# Altium footprint library OltestLib.PcbLib: 139 footprints (part 4 of 9)
Each footprint in its own frame and in the unit in brackets; x right, y up, seen from the top. Pads: shape width x height; smd on the part's side, far side on the other; paste and mask are expansions set on the pad; w line width, h text height; cw(c..) or ccw(c..) is an arc to the next point about the centre after c.
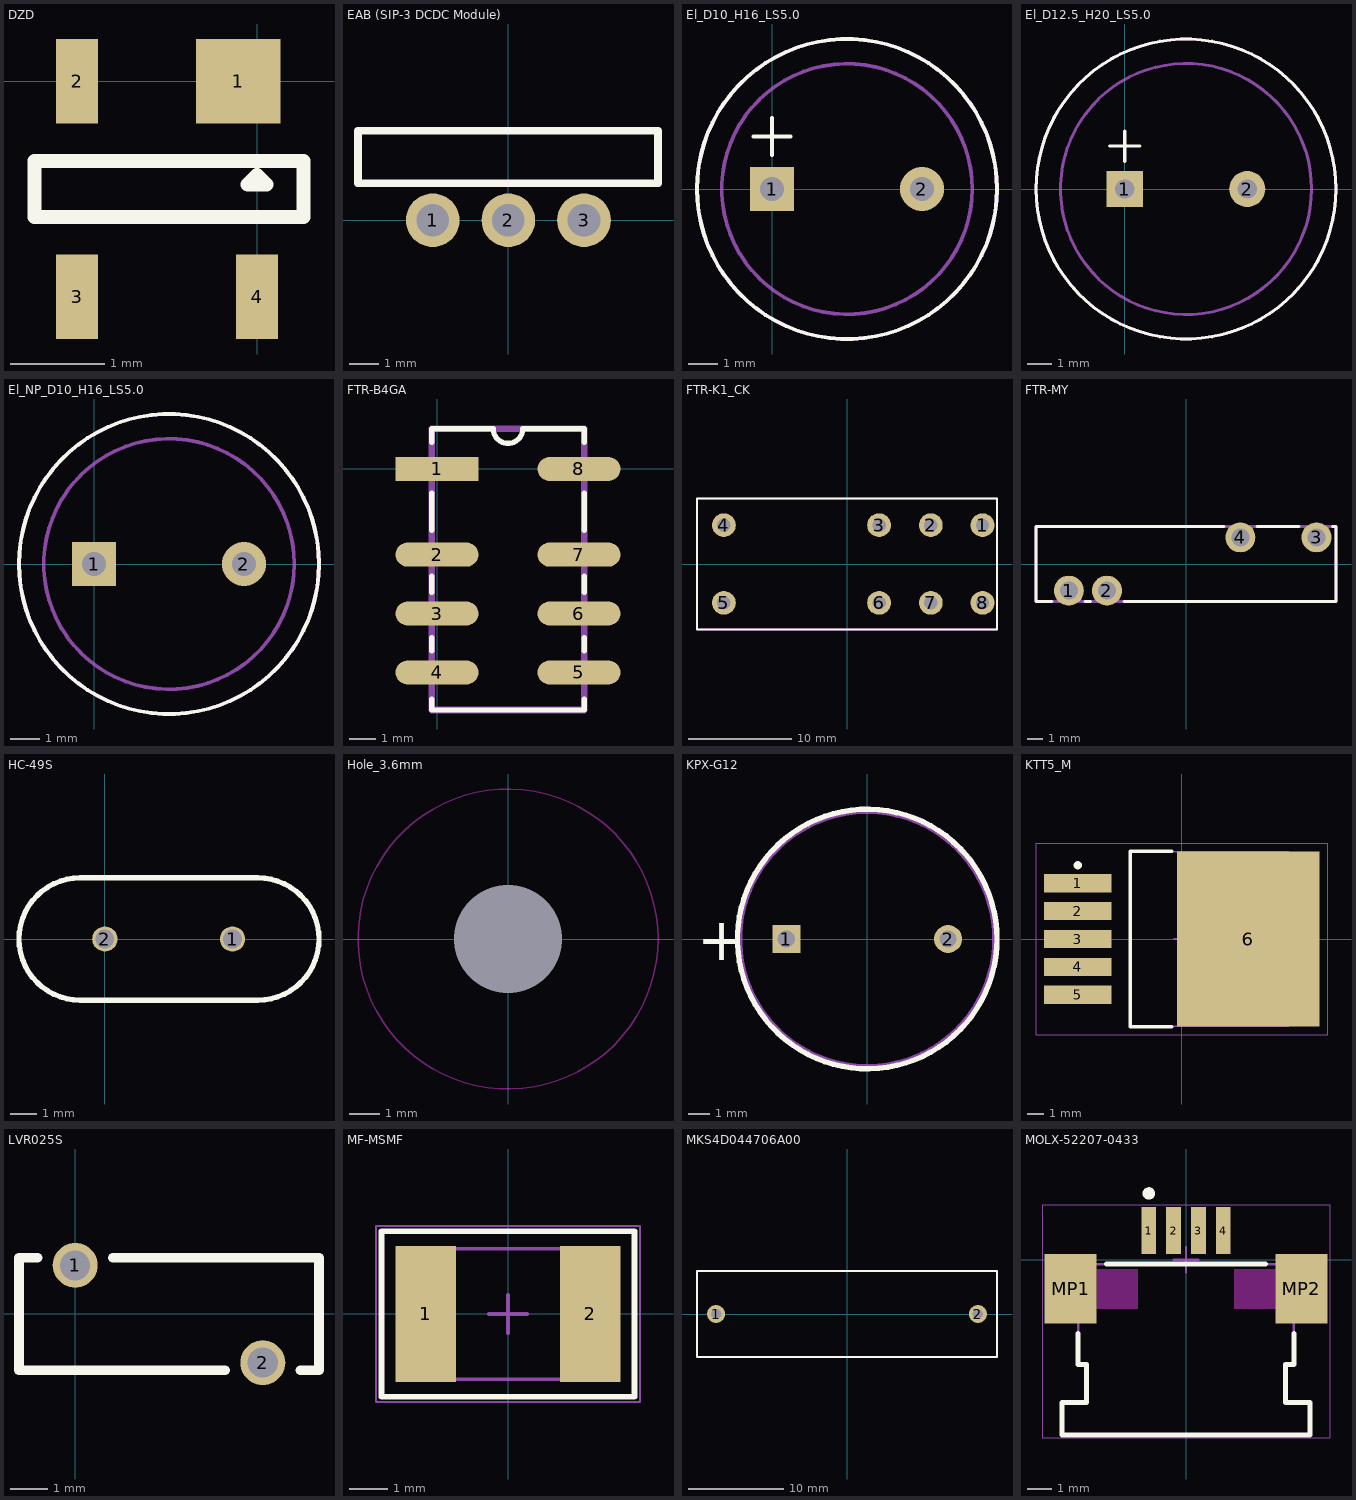
[diagram p3: the footprints below, top view; thin cyan lines are the x and y axes]

## DZD [mm]
pads (4):
  rect 0.899x0.899 smd mask+0.102: 1(-0.2,0)
  rect 0.45x0.899 smd mask+0.102: 2(-1.92,0) 3(-1.92,-2.3) 4(0,-2.3)
Top Overlay:
  lines w0.15: -2.376,-1.45 -2.376,-0.85 0.496,-0.85 0.496,-1.45 -2.376,-1.45 ; -0.1,-1.1 0.1,-1.1 0,-1 -0.1,-1.1
3D body: height 1.2, standoff 0.1, extent -2.376,-1.832 0.496,-0.483

## EAB (SIP-3 DCDC Module) [mm]
pads (3):
  round 1.8 hole 1.1: 1(-2.54,0) 2(0,0) 3(2.54,0)
Top Overlay:
  lines w0.254: -5.05,1.25 5.025,1.25 5.025,3 -5.05,3 -5.05,1.25
3D body "EAB0003A.stp": height 11.01, standoff -3.99, extent -5,-5.03 5,3.77

## El_D10_H16_LS5.0 [mm]
height 16
pads (2):
  rect 1.5x1.5 hole 0.8: 1(0,0)
  round 1.5 hole 0.8: 2(5.08,0)
Top Overlay:
  circle w0.127: c2.54,0 r5.08
  lines w0.127: -0.635,1.778 0.635,1.778 ; 0,1.143 0,2.413
Mechanical 13:
  circle w0.127: c2.54,0 r5.08
  circle w0.127: c2.54,0 r4.242
  circle w0.127: c2.54,0 r5.08
3D body: height 4.06, standoff 2.03, extent -1.701,-4.241 6.781,4.241
3D body: height 2.03, standoff 0, extent -2.539,-5.079 7.619,5.079
3D body: height 11.94, standoff 4.06, extent -2.539,-5.079 7.619,5.079

## El_D12.5_H20_LS5.0 [mm]
height 20
pads (2):
  rect 1.5x1.5 hole 0.8: 1(0,0)
  round 1.5 hole 0.8: 2(5.08,0)
Top Overlay:
  circle w0.127: c2.54,0 r6.223
  lines w0.127: -0.635,1.778 0.635,1.778 ; 0,1.143 0,2.413
Mechanical 13:
  circle w0.127: c2.54,0 r6.223
  circle w0.127: c2.54,0 r5.207
  circle w0.127: c2.54,0 r6.223
3D body: height 2.03, standoff 0, extent -3.682,-6.222 8.762,6.222
3D body: height 16, standoff 4.06, extent -3.682,-6.222 8.762,6.222
3D body: height 4.06, standoff 2.03, extent -2.666,-5.206 7.746,5.206

## El_NP_D10_H16_LS5.0 [mm]
height 16
pads (2):
  rect 1.5x1.5 hole 0.8: 1(0,0)
  round 1.5 hole 0.8: 2(5.08,0)
Top Overlay:
  circle w0.127: c2.54,0 r5.08
Mechanical 13:
  circle w0.127: c2.54,0 r5.08
  circle w0.127: c2.54,0 r4.242
  circle w0.127: c2.54,0 r5.08
3D body: height 11.94, standoff 4.06, extent -2.539,-5.079 7.619,5.079
3D body: height 2.03, standoff 0, extent -2.539,-5.079 7.619,5.079
3D body: height 4.06, standoff 2.03, extent -1.701,-4.241 6.781,4.241

## FTR-B4GA [mm] "FTR-B4GA"
height 9.7
pads (8):
  rect 3.1x0.9 smd: 1(0,0)
  oval 3.1x0.9 smd: 2(0,-3.2) 3(0,-5.4) 4(0,-7.6) 5(5.3,-7.6) 6(5.3,-5.4) 7(5.3,-3.2) 8(5.3,0)
Top Overlay:
  lines w0.2: -0.2,-8.6 -0.2,-9 5.5,-9 5.5,-8.6 ; -0.2,-6.8 -0.2,-6.3 ; -0.2,-4.6 -0.2,-4 ; -0.2,-2.3 -0.2,-0.9 ; -0.2,1 -0.2,1.5 2.1,1.5 ccw(c2.65,1.5) 3.2,1.5 5.5,1.5 5.5,1 ; 5.5,-6.8 5.5,-6.3 ; 5.5,-4.6 5.5,-4 ; 5.5,-2.3 5.5,-0.9
Mechanical 13:
  lines w0.254: -0.2,-9 5.5,-9 5.5,1.5 -0.2,1.5 -0.2,-9
3D body: height 9.7, standoff 0, extent -0.199,-8.999 5.499,1.499

## FTR-K1_CK [mm] "FTR-K1 1 form C"
height 15.697
pads (8):
  round 2.3 hole 1.3: 1(13.1,3.75) 2(8.1,3.75) 3(3.1,3.75) 4(-11.9,3.75) 5(-11.9,-3.75) 6(3.1,-3.75) 7(8.1,-3.75) 8(13.1,-3.75)
Top Overlay:
  lines w0.203: -14.5,-6.35 14.5,-6.35 14.5,6.35 -14.5,6.35 -14.5,-6.35
Mechanical 13:
  lines w0.203: -14.5,-6.35 -14.5,6.35 14.5,6.35 14.5,-6.35 -14.5,-6.35
3D body: height 15.7, standoff 0, extent -14.499,-6.349 14.499,6.349

## FTR-MY [mm] "FTR-MY"
height 11.989
pads (4):
  round 2 hole 1.2: 1(-7.81,-1.775) 2(-5.27,-1.775) 3(8.7,1.775) 4(3.62,1.775)
Top Overlay:
  lines w0.203: -8.95,-2.5 -10,-2.5 -10,2.5 2.525,2.5 ; -6.725,-2.5 -6.375,-2.5 ; -4.125,-2.5 10,-2.5 10,2.5 9.775,2.5 ; 4.75,2.5 7.525,2.5
Mechanical 13:
  lines w0.203: -10,-2.5 10,-2.5 10,2.5 -10,2.5 -10,-2.5
3D body: height 11.99, standoff 0, extent -9.999,-2.499 9.999,2.499

## HC-49S [mil]
pads (2):
  round 38 / inner round 0 / far side round 57 hole 28 mask+3: 1(192,0) 2(0,0)
Top Overlay:
  lines w8: -37,-92 cw(c-37,0) -37,92 230,92 cw(c230,0) 230,-92 -37,-92
3D body: height 0, standoff 0, extent -41.01,-88.55 -41,-88.55
3D body "HC49S.stp": height 150.61, standoff -117.11, extent -127.42,-92.07 319.43,91

## Hole_3.6mm [mm] "Hole_3.6mm"
pads (1):
  round 0 hole 3.6: H(0,0)
Keep-Out Layer:
  circle w0.05: c0,0 r5.001

## KPX-G12 [mil]
height 295.28
pads (2):
  rect 52x52 hole 32: 1(-149.61,0)
  round 52 hole 32: 2(149.61,0)
Top Overlay:
  circle w10: c0,0 r240.16
  text "+" at -314.96,-39.37 h78.74
Mechanical 13:
  circle w10: c0,0 r236.22
3D body: height 295.28, standoff 0, extent -236.2,-236.2 236.2,236.2

## KTT5_M [mm] "D2-PAK, 6-Leads, Body 8.9x10.2mm, Pitch 1.7mm, Lead Span 15.2mm, IPC Low Density"
height 4.83
pads (6):
  rect 4.1x1.1 smd: 1(-6.35,3.4) 2(-6.35,1.7) 3(-6.35,0) 4(-6.35,-1.7) 5(-6.35,-3.4)
  rect 8.7x10.7 smd: 6(4.05,0)
Top Overlay:
  circle w0.25: c-6.35,4.5 r0.125
  lines w0.2: -0.6,-5.35 -3.15,-5.35 -3.15,5.35 -0.6,5.35
Mechanical 13:
  lines w0.1: -3.15,-5.325 -3.15,5.325 6.5,5.325 6.5,-5.325 -3.15,-5.325
Mechanical 15:
  lines w0.05: -8.9,-5.85 -8.9,5.85 8.9,5.85 8.9,-5.85 -8.9,-5.85
  lines w0.1: -0.5,0 0.5,0 ; 0,-0.5 0,0.5
3D body: height 4.83, standoff 0, extent -3.15,-5.325 6.5,5.325

## LVR025S [mm] "Fuse Thermal"
height 14
pads (2):
  round 1.2 hole 0.8: 1(0,1.3) 2(5,-1.3)
Top Overlay:
  lines w0.254: -1,1.5 -1.5,1.5 -1.5,-1.5 4,-1.5 ; 1,1.5 6.5,1.5 6.5,-1.5 6,-1.5
3D body "SW3dPS-PTCR, 240 V, Raychem LVR025S.STEP": height 15.4, standoff -4.08, extent -1.83,-1.8 6.83,1.8

## MF-MSMF [mm] "2-Leads, Body 4,55x3,24mm, IPC Low Density"
height 1
pads (2):
  rect 1.57x3.54 smd: 1(-2.145,0) 2(2.145,0)
Top Overlay:
  lines w0.152: -3.302,-2.159 -3.302,2.159 3.302,2.159 3.302,-2.159 -3.302,-2.159
Mechanical 13:
  lines w0.1: -2.365,-1.705 -2.365,1.705 2.365,1.705 2.365,-1.705 -2.365,-1.705
Mechanical 15:
  lines w0.05: -3.45,-2.3 -3.45,2.3 3.45,2.3 3.45,-2.3 -3.45,-2.3
  lines w0.1: -0.5,0 0.5,0 ; 0,-0.5 0,0.5
3D body "INDC4632X10M.step": height 1, standoff 0, extent -2.365,-1.705 2.365,1.705

## MKS4D044706A00 [mm]
height 19
pads (2):
  round 1.9 hole 1.1: 1(-13.75,0) 2(13.75,0)
Top Overlay:
  lines w0.203: -15.75,-4.5 15.75,-4.5 15.75,4.5 -15.75,4.5 -15.75,-4.5
Mechanical 13:
  lines w0.152: -15.75,-4.5 15.75,-4.5 15.75,4.5 -15.75,4.5 -15.75,-4.5
3D body: height 19, standoff 0, extent -15.749,-4.499 15.749,4.499

## MOLX-52207-0433 [mm] "FPC Connector, 4-Leads, Right Angle, Pitch 1.0 mm, Mated Height 2.7 mm, SMT"
height 2.712
pads (6):
  rect 0.6x1.9 smd: 1(-1.5,1.175) 2(-0.5,1.175) 3(0.5,1.175) 4(1.5,1.175)
  rect 2.1x2.8 smd: MP1(-4.65,-1.175) MP2(4.65,-1.175)
Top Overlay:
  circle w0.25: c-1.5,2.675 r0.125
  lines w0.2: -4.35,-2.975 -4.35,-4.225 ; -3.2,-0.175 3.2,-0.175 ; 4.35,-2.975 4.35,-4.225 ; -4.35,-4.225 -4.35,-4.225 ; -4.35,-4.225 -4.013,-4.225 -4.012,-4.225 -4.012,-5.765 -5,-5.765 -5,-7.075 5,-7.075 5,-5.765 4.012,-5.765 4.012,-4.225 4.013,-4.225 4.35,-4.225 ; 4.35,-4.225 4.35,-4.225
Keep-Out Layer:
  region: 3.6,-0.375 1.95,-0.375 1.95,-1.975 3.6,-1.975
  region: -3.6,-0.375 -1.95,-0.375 -1.95,-1.975 -3.6,-1.975
Mechanical 13:
  lines w0.1: -5.15,-2.175 -4.35,-2.175 -4.35,-4.225 -4.012,-4.225 -4.012,-5.765 -5,-5.765 -5,-7.075 5,-7.075 5,-5.765 4.012,-5.765 4.012,-4.225 4.35,-4.225 4.35,-2.175 5.15,-2.175 5.15,-0.175 -5.15,-0.175 -5.15,-2.175
Mechanical 15:
  lines w0.05: -5.8,-7.175 5.8,-7.175 5.8,2.225 -5.8,2.225 -5.8,-7.175
  lines w0.1: -0.5,0 0.5,0 ; 0,-0.5 0,0.5
3D body "522070433.stp": height 2.71, standoff 0.01, extent -5.15,-7.075 5.15,1.825